# Altium footprint library THU VIEN PCB.PCBLib: 534 footprints (part 19 of 34)
Each footprint in its own frame and in the unit in brackets; x right, y up, seen from the top. Pads: shape width x height; smd on the part's side, far side on the other; paste and mask are expansions set on the pad; w line width, h text height; cw(c..) or ccw(c..) is an arc to the next point about the centre after c.
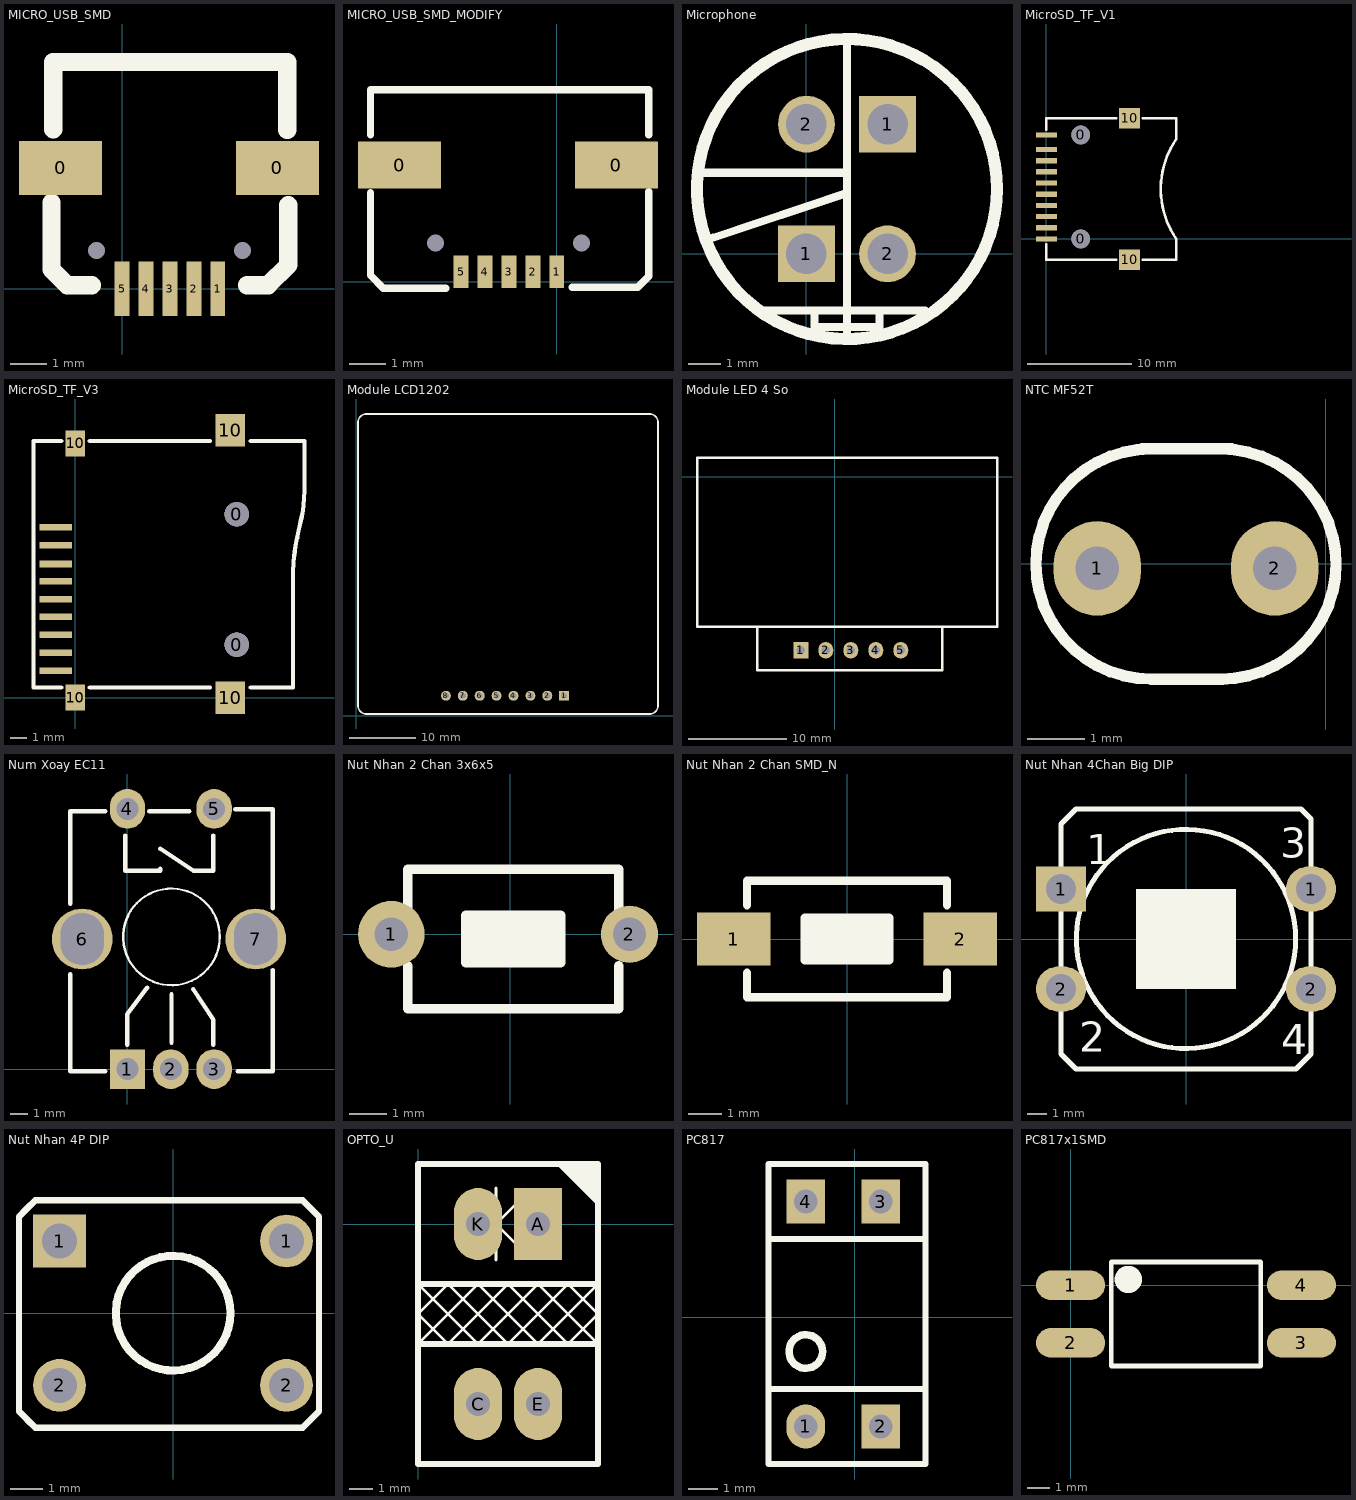
[diagram p18: the footprints below, top view; thin cyan lines are the x and y axes]

## MICRO_USB_SMD [mm] "QFN, 14-Leads, Body 4.00x4.00mm, Pitch 0.50mm, Thermal Pad 4.00x2.20mm, IPC Medium Density"
height 0.8
pads (9):
  rect 2.3x1.5 smd: 0(-1.7,3.346) 0(4.3,3.346)
  rect 0.41x1.5 smd: 1(2.65,0) 2(1.987,0) 3(1.325,0) 4(0.662,0) 5(0,0)
  round 0 hole 0.47: 6(-0.7,1.067) 7(3.339,1.067)
Top Overlay:
  lines w0.508: -1.952,2.388 -1.952,0.533 -1.52,0.102 -0.838,0.102 ; -1.901,4.42 -1.901,6.274 4.576,6.274 4.576,4.394 ; 3.459,0.102 4.043,0.102 4.602,0.66 4.602,2.311
3D body "2174507-2.stp": height 2.68, standoff -0.02, extent -2.503,0.334 5.297,5.334

## MICRO_USB_SMD_MODIFY [mm]
pads (9):
  rect 2.3x1.3 smd: 0(-4.35,3.226) 0(1.65,3.226)
  rect 0.41x0.9 smd: 1(0,0.279) 2(-0.662,0.279) 3(-1.325,0.279) 4(-1.987,0.279) 5(-2.65,0.279)
  round 0 hole 0.47: 6(-3.35,1.067) 7(0.689,1.067)
Top Overlay:
  lines w0.203: -5.156,2.464 -5.156,0.178 -4.801,-0.178 -3.073,-0.178 ; -5.156,4.064 -5.156,5.309 2.54,5.309 2.54,4.064 ; 0.432,-0.152 2.235,-0.152 2.54,0.152 2.54,2.489
3D body "2174507-2.stp": height 2.68, standoff -0.02, extent -5.153,0.334 2.647,5.334

## Microphone [mil]
pads (4):
  rect 70x70 hole 50: 1(0,0) 1(100,160)
  round 70 hole 50: 2(0,160) 2(100,0)
Top Overlay:
  circle w15: c50,80 r185
  lines w10: -135,100 50,100 ; -115,20 50,75 ; -56.15,-70 146.54,-70 ; 10,-70 10,-90 90,-90 90,-70 ; 50,-105 50,230 ; 50,-70 50,265
3D body "microphone.step": height 202.76, standoff -158.17, extent -140.94,-110.94 240.95,270.94

## MicroSD_TF_V1 [mm]
pads (14):
  round 1.8 hole 1.8: 0(3.3,0) 0(3.3,10)
  rect 2x0.5 smd: 1(0,7.525) 2(0,6.45) 3(0,5.375) 4(0,4.3) 5(0,3.225) 6(0,2.15) 7(0,1.075) 8(0,0) 9(0,8.6) 10(0,10)
  rect 2x2 smd: 10(8,-2) 10(8,11.6)
Top Overlay:
  lines w0.254: 0,-0.5 0,-2 6.7,-2 ; 0,10.5 0,11.6 6.7,11.6 ; 9.3,-2 12.5,-2 12.5,0 cw(c19.43,4.8) 12.5,9.6 12.5,11.6 9.3,11.6

## MicroSD_TF_V3 [mm]
pads (15):
  round 1.5 hole 1.5: 0(9.9,3.25) 0(9.9,11.25)
  rect 2x0.4 smd: 1(-1.2,10.45) 2(-1.2,9.35) 3(-1.2,8.2) 4(-1.2,7.15) 5(-1.2,6.05) 6(-1.2,4.95) 7(-1.2,3.85) 8(-1.2,2.75) 9(-1.2,1.65)
  rect 1.2x1.6 smd: 10(0,0) 10(0,15.6)
  rect 1.8x2 smd: 10(9.5,0) 10(9.5,16.4)
Top Overlay:
  lines w0.254: -0.875,0.625 -2.575,0.625 -2.575,15.75 -0.875,15.75 ; 0.875,0.625 8.25,0.625 ; 0.875,15.75 8.25,15.75 ; 10.75,0.625 13.35,0.625 13.35,7.65 13.375,8.35 13.45,8.975 13.5,9.325 13.6,9.8 13.75,10.5 13.85,10.975 13.95,11.475 14.025,12.175 14.05,12.75 14.05,15.75 10.75,15.75
Bottom Solder:
  circle w0.013: c9.9,11.25 r0.6
  circle w0.013: c9.9,3.25 r0.6
3D body "User Library-MEM2055-00-190-01-A_revG.STEP": height 1.86, standoff -0.59, extent -1.385,0.189 13.865,16.189

## Module LCD1202 [mm]
pads (8):
  rect 1.5x1.5 hole 0.9: 1(31.267,3.023)
  round 1.5 hole 0.9: 2(28.727,3.023) 3(26.187,3.023) 4(23.647,3.023) 5(21.107,3.023) 6(18.567,3.023) 7(16.027,3.023) 8(13.487,3.023)
Top Overlay:
  lines w0.254: 0.279,1.549 ccw(c1.549,1.549) 1.549,0.279 44.094,0.279 ccw(c44.094,1.549) 45.364,1.549 45.364,44.094 ccw(c44.094,44.094) 44.094,45.364 2.819,45.364 1.549,45.364 ccw(c1.549,44.094) 0.279,44.094 0.279,42.824 0.279,1.549
Bottom Overlay:
  lines w0.2: 12.217,1.753 12.217,4.293 32.537,4.293 32.537,1.753 12.217,1.753
3D body: height 1.5, standoff 0, extent 19.837,1.753 22.377,4.293
3D body: height 7, standoff -1, extent 20.717,2.616 21.514,3.415
3D body: height 1.5, standoff 0, extent 22.377,1.753 24.917,4.293
3D body: height 7, standoff -1, extent 23.257,2.616 24.054,3.415
3D body: height 1.5, standoff 0, extent 24.917,1.753 27.457,4.293
3D body: height 7, standoff -1, extent 25.797,2.616 26.594,3.415
3D body: height 1.5, standoff 0, extent 27.457,1.753 29.997,4.293
3D body: height 7, standoff -1, extent 28.337,2.616 29.134,3.415
3D body: height 1.5, standoff 0, extent 29.997,1.753 32.537,4.293
3D body: height 7, standoff -1, extent 30.877,2.616 31.674,3.415
3D body: height 1.5, standoff 0, extent 12.217,1.753 14.757,4.293
3D body: height 7, standoff -1, extent 13.097,2.616 13.894,3.415
3D body: height 1.5, standoff 0, extent 14.757,1.753 17.297,4.293
3D body: height 7, standoff -1, extent 15.637,2.616 16.434,3.415
3D body: height 1.5, standoff 0, extent 17.297,1.753 19.837,4.293
3D body: height 7, standoff -1, extent 18.177,2.616 18.974,3.415
3D body "lcd1202.stp": height 5.84, standoff 2.54, extent 4.753,1.02 40.753,39.074

## Module LED 4 So [mil]
pads (5):
  rect 60x65 hole 35.43: 1(-135,-695)
  oval 60x65 hole 35.43: 2(-35,-695) 3(65,-695) 4(165,-695) 5(265,-695)
Top Overlay:
  lines w10: -310,-600 -310,-775 430,-775 430,-600 ; -550,-600 -550,75 650,75 650,-600 -550,-600
3D body "MH.stp": height 348.43, standoff 92.52, extent -559.67,-778.68 641.12,87.47
3D body: height 275.59, standoff -39.37, extent -151,-711 -119.63,-679.57
3D body: height 275.59, standoff -39.37, extent -51,-711 -19.63,-679.57
3D body: height 275.59, standoff -39.37, extent 49,-711 80.37,-679.57
3D body: height 275.59, standoff -39.37, extent 149,-711 180.37,-679.57
3D body: height 275.59, standoff -39.37, extent 259,-711 290.37,-679.57

## NTC MF52T [mil] "Capacitor, Ceramic, ThrNTC 2A"
height 196.85
pads (2):
  oval 60x65 hole 30: 1(-157,-3) 2(-35,-3)
Top Overlay:
  lines w7.87: -126,79.06 -65,79.06 ; -120,79.06 ccw(c-120,0) -120,-79.06 -71,-79.06 ; -72,-79.11 ccw(c-72,-0.06) -72,79
3D body "NTC.step": height 198.71, standoff -76.88, extent -213.99,-77.22 22.12,73.23

## Num Xoay EC11 [mm]
pads (7):
  rect 2.032x2.286 hole 1.27: 1(0,0)
  oval 2.032x2.286 hole 1.27: 2(2.5,0) 3(5,0) 4(0,15) 5(5,15)
  round 3.5 hole 2.5 slot 3 at 90 deg: 6(-2.601,7.5) 7(7.396,7.5)
Top Overlay:
  circle w0.127: c2.54,7.62 r2.785
  lines w0.254: -3.302,5.461 -3.302,-0.127 -1.27,-0.127 ; -3.302,9.525 -3.302,14.859 -1.27,14.859 ; -0.127,13.462 -0.127,11.43 1.905,11.43 1.905,11.557 ; 0,1.397 0,3.175 1.143,4.699 ; 1.27,14.859 3.556,14.859 ; 1.905,12.7 3.81,11.43 4.953,11.43 4.953,13.462 ; 2.54,1.524 2.54,4.318 ; 3.79,4.601 4.953,2.857 4.953,1.397 ; 6.223,14.986 8.255,14.986 8.382,14.986 8.382,9.271 ; 6.35,-0.127 8.382,-0.127 8.382,5.715
3D body "EC11E-05SW.step": height 24.5, standoff -3.65, extent -3.316,-0.105 8.396,14.845

## Nut Nhan 2 Chan 3x6x5 [mil]
pads (2):
  round 70 hole 35: 1(-125,0)
  round 60 hole 35: 2(125,0)
Top Overlay:
  rectangle: -47,-30 53,20
  lines w10: -108,-33 -108,-78 114,-78 114,-33 ; -108,23 -108,68 114,68 114,23 ; -47,-30 -47,20 53,20 53,-30 -47,-30
3D body "User Library-Button-SMD.step": height 98.43, standoff 0, extent -117.07,-77.83 123.09,67.84

## Nut Nhan 2 Chan SMD_N [mm] "Switch SMD type"
pads (2):
  rect 2.2x1.6 smd: 1(-3.4,0) 2(3.4,0)
Top Overlay:
  rectangle: -1.27,-0.635 1.27,0.635
  lines w0.254: -3,-1.016 -3,-1.75 3,-1.75 3,-1.016 ; -3,1.016 -3,1.75 3,1.75 3,1.016 ; -1.27,-0.635 1.27,-0.635 1.27,0.635 -1.27,0.635 -1.27,-0.635
3D body "User Library-Button-SMD.step": height 2.5, standoff 0, extent -3.05,-1.85 3.05,1.85

## Nut Nhan 4Chan Big DIP [mil] "Nut an to"
pads (4):
  rect 100x90 hole 60: 1(-250,100)
  oval 100x90 hole 60: 1(250,100) 2(-250,-100) 2(250,-100)
Top Overlay:
  circle w10: c0,0 r219.32
  rectangle: -100,-100 100,100
  lines w10: -250,-140 -250,-230 -220,-260 220,-260 250,-230 250,-140 ; -250,-60 -250,60 ; -250,140 -250,230 -220,260 230,260 250,240 250,140 ; 250,-60 250,60
  text "4" at 190,-230 h60
  text "3" at 188,163 h60
  text "2" at -214,-225 h60
  text "1" at -200,150 h60
3D body "bu12x12.stp": height 514.38, standoff 0.6, extent -239.73,-237.14 232.72,235.3

## Nut Nhan 4P DIP [mil] "BUTTON SMORE 280mil x 178mil"
height 100
pads (4):
  rect 65x65 hole 43.31: 1(-140,89)
  round 65 hole 43.31: 1(140,89) 2(-140,-89) 2(140,-89)
Top Overlay:
  circle w10: c0,0 r70.71
  lines w8: -180,-131 -170,-141 ; -170,-141 160,-141 180,-121 180,119 160,139 -160,139 -170,139 -180,129 -190,119 -190,-121 -170,-141
3D body "SW3dPS-.STEP": height 275.59, standoff -137.8, extent -158.51,-124.04 152.51,120.05

## OPTO_U [mil] "Opto hinh chu U"
height 104.33
pads (4):
  rect 80x120 hole 40: A(200,0)
  oval 80x120 hole 40: C(100,-300) E(200,-300) K(100,0)
Top Overlay:
  region: 297.5,97.5 232.5,97.5 297.5,32.5
  lines w5: 0,-200 50,-150 100,-100 200,-200 230,-170 300,-100 300,-200 200,-100 100,-200 90,-190 60,-160 0,-100 ; 130,-60 130,60 ; 180,-50 130,0 180,50 ; 180,-50 180,50 ; 180,-50 180,50 ; 0,-150 50,-100 150,-200 250,-100 300,-150 250,-200 150,-100 50,-200 30,-180 0,-150
  lines w10: 0,-200 300,-200 ; 0,-150 0,-110 ; 0,-100 300,-100 ; 300,-150 300,-140 ; 0,-400 0,100 300,100 300,-400 0,-400
3D body "SW3dPS-optek opb620.STEP": height 374.02, standoff -100, extent 43.46,-346.85 260,46.85

## PC817 [mm]
pads (4):
  oval 1.3x1.5 hole 0.8: 1(-1.651,-3.708)
  rect 1.3x1.5 hole 0.8: 2(0.889,-3.708) 3(0.889,3.912) 4(-1.651,3.912)
Top Overlay:
  circle w0.254: c-1.651,-1.168 r0.568
  lines w0.203: -2.921,-2.438 -2.921,-1.168 -2.921,1.372 -2.921,5.182 2.413,5.182 2.413,2.642 ; -2.921,-2.438 -2.921,-4.978 2.413,-4.978 2.413,-2.184 2.413,2.642 ; -2.921,-2.438 -2.921,2.642 ; -2.921,-2.438 2.413,-2.438 ; -2.921,-2.438 -2.921,2.642 ; -2.921,-2.438 2.413,-2.438 ; -2.921,2.642 2.413,2.642 ; -2.921,2.642 2.413,2.642 ; 2.413,-2.438 2.413,2.642
3D body "PC817.step": height 4.81, standoff -2.19, extent -2.6,-3.94 1.991,3.94

## PC817x1SMD [mm] "SMD"
height 5
pads (4):
  oval 3.048x1.3 smd: 1(0,0) 2(0,-2.54) 3(10.16,-2.54) 4(10.16,0)
Top Overlay:
  circle w1: c2.54,0.254 r0.1
  lines w0.2: 1.78,-3.56 1.78,1.02 8.38,1.02 8.38,-3.56 1.78,-3.56
3D body "PC817 SMD.STEP": height 3.87, standoff 0.02, extent 0.08,-3.56 10.08,1.02